# Altium footprint library Connectors.PcbLib: 268 footprints (part 5 of 21)
Each footprint in its own frame and in the unit in brackets; x right, y up, seen from the top. Pads: shape width x height; smd on the part's side, far side on the other; paste and mask are expansions set on the pad; w line width, h text height; cw(c..) or ccw(c..) is an arc to the next point about the centre after c.
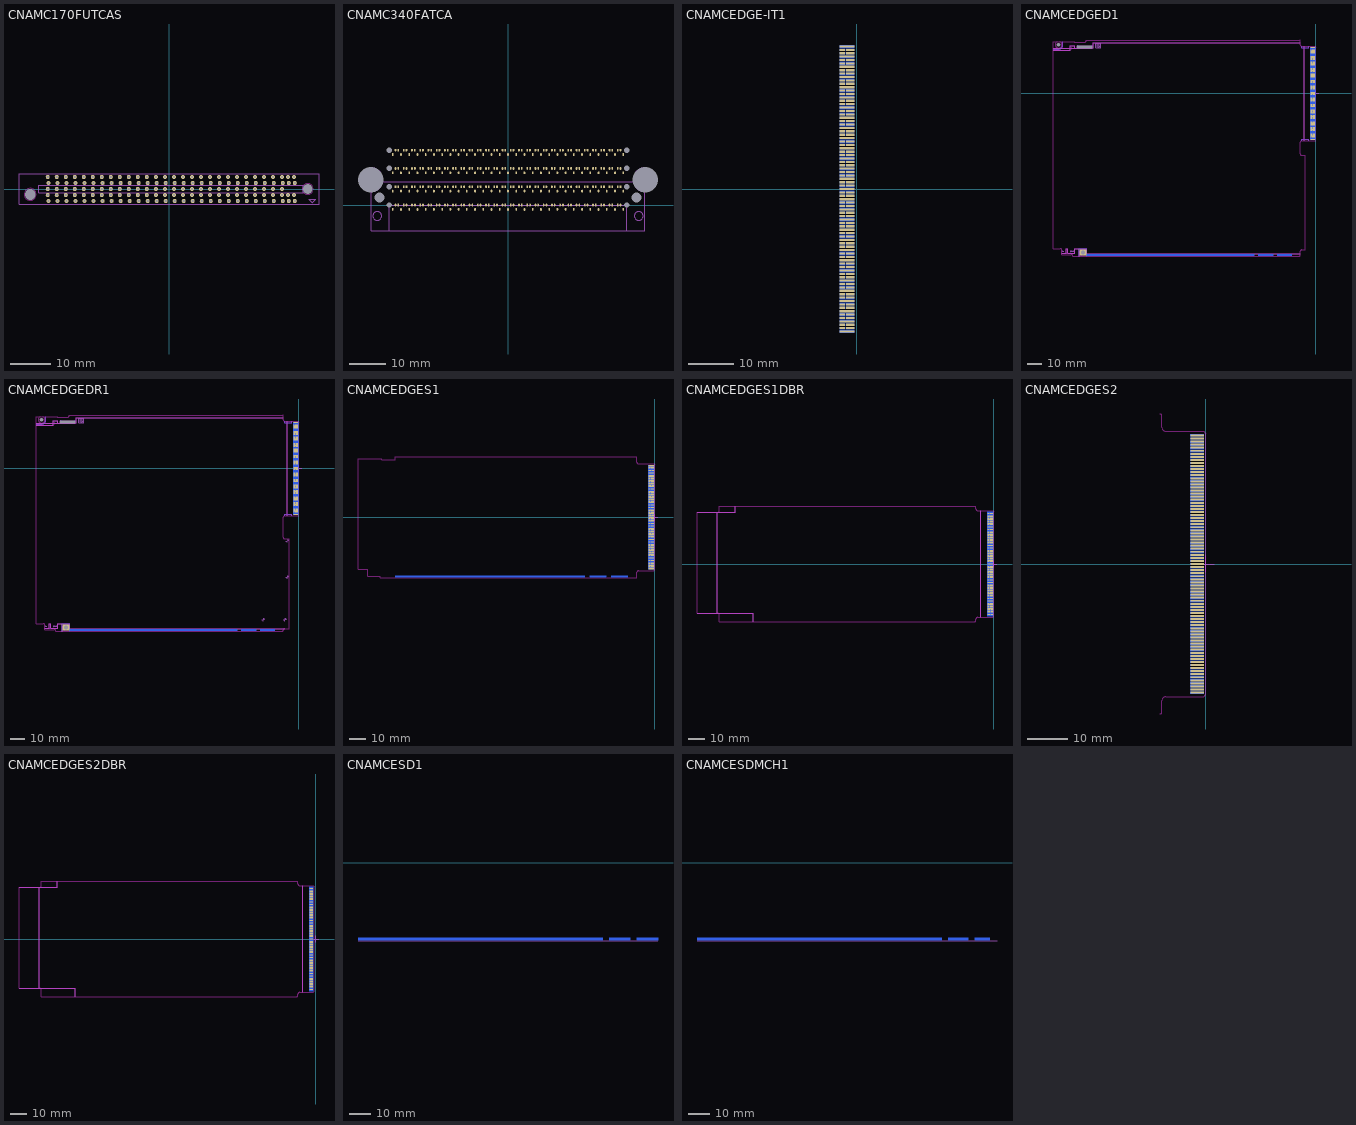
[diagram p4: the footprints below, top view; thin cyan lines are the x and y axes]

## CNAMC170FUTCAS [mm] "AMC uTCA 170 pin vertical snap-in"
height 12.9
pads (172):
  round 1 hole 0.55: 1(31.425,-3) 2(31.225,-1.5) 3(29.925,-3) 4(29.725,-1.5) 5(28.425,-3) 6(28.225,-1.5) 7(28.225,0) 8(26.175,-3) 9(25.975,-1.5) 10(25.975,0) 11(23.925,-3) 12(23.725,-1.5) 13(23.725,0) 14(21.675,-3) 15(21.475,-1.5) 16(21.475,0) 17(19.425,-3) 18(19.225,-1.5) 19(19.225,0) 20(17.175,-3) 21(16.975,-1.5) 22(16.975,0) 23(14.925,-3) 24(14.725,-1.5) 25(14.725,0) 26(12.675,-3) 27(12.475,-1.5) 28(12.475,0) 29(10.425,-3) 30(10.225,-1.5) 31(10.225,0) 32(8.175,-3) 33(7.975,-1.5) 34(7.975,0) 35(5.925,-3) 36(5.725,-1.5) 37(5.725,0) 38(3.675,-3) 39(3.475,-1.5) 40(3.475,0) 41(1.425,-3) 42(1.225,-1.5) 43(1.225,0) 44(-0.825,-3) 45(-1.025,-1.5) 46(-1.025,0) 47(-3.075,-3) 48(-3.275,-1.5) 49(-3.275,0) 50(-5.325,-3) 51(-5.525,-1.5) 52(-5.525,0) 53(-7.575,-3) 54(-7.775,-1.5) 55(-7.775,0) 56(-9.825,-3) 57(-10.025,-1.5) 58(-10.025,0) 59(-12.075,-3) 60(-12.275,-1.5) 61(-12.275,0) 62(-14.325,-3) 63(-14.525,-1.5) 64(-14.525,0) 65(-16.575,-3) 66(-16.775,-1.5) 67(-16.775,0) 68(-18.825,-3) 69(-19.025,-1.5) 70(-19.025,0) 71(-21.075,-3) 72(-21.275,-1.5) 73(-21.275,0) 74(-23.325,-3) 75(-23.525,-1.5) 76(-23.525,0) 77(-25.575,-3) 78(-25.775,-1.5) 79(-25.775,0) 80(-27.825,-3) 81(-28.025,-1.5) 82(-28.025,0) 83(-30.075,-3) 84(-30.275,-1.5) 85(-30.275,0) 87(-30.275,3) 88(-30.075,1.5) 90(-28.025,3) 91(-27.825,1.5) 93(-25.775,3) 94(-25.575,1.5) 96(-23.525,3) 97(-23.325,1.5) 99(-21.275,3) 100(-21.075,1.5) 102(-19.025,3) 103(-18.825,1.5) 105(-16.775,3) 106(-16.575,1.5) 108(-14.525,3) 109(-14.325,1.5) 111(-12.275,3) 112(-12.075,1.5) 114(-10.025,3) 115(-9.825,1.5) 117(-7.775,3) 118(-7.575,1.5) 120(-5.525,3) 121(-5.325,1.5) 123(-3.275,3) 124(-3.075,1.5) 126(-1.025,3) 127(-0.825,1.5) 129(1.225,3) 130(1.425,1.5) 132(3.475,3) 133(3.675,1.5) 135(5.725,3) 136(5.925,1.5) 138(7.975,3) 139(8.175,1.5) 141(10.225,3) 142(10.425,1.5) 144(12.475,3) 145(12.675,1.5) 147(14.725,3) 148(14.925,1.5) 150(16.975,3) 151(17.175,1.5) 153(19.225,3) 154(19.425,1.5) 156(21.475,3) 157(21.675,1.5) 159(23.725,3) 160(23.925,1.5) 162(25.975,3) 163(26.175,1.5) 165(28.225,3) 166(28.425,1.5) 167(29.725,3) 168(29.925,1.5) 169(31.225,3) 170(31.425,1.5)
  round 0.48 smd: 86(-30.275,0) 89(-28.025,0) 92(-25.775,0) 95(-23.525,0) 98(-21.275,0) 101(-19.025,0) 104(-16.775,0) 107(-14.525,0) 110(-12.275,0) 113(-10.025,0) 116(-7.775,0) 119(-5.525,0) 122(-3.275,0) 125(-1.025,0) 128(1.225,0) 131(3.475,0) 134(5.725,0) 137(7.975,0) 140(10.225,0) 143(12.475,0) 146(14.725,0) 149(16.975,0) 152(19.225,0) 155(21.475,-0.025) 158(23.725,0) 161(25.975,0) 164(28.225,0)
  round 0 hole 2.7 unplated: MH1(-34.65,-1.35)
  round 0 hole 2.4 unplated: MH2(34.65,0)
Keep-Out Layer:
  circle w0.1: c-34.65,-1.35 r1.5
  circle w0.1: c34.65,0 r1.35
Mechanical 13:
  lines w0.1: -37.45,-3.75 37.45,-3.75 37.45,3.75 -37.45,3.75 -37.45,-3.75 ; -32.575,-0.95 -32.575,0.95 33.575,0.95 33.575,-0.95 -32.575,-0.95 ; 34.9,-2.5 35.8,-3.4 36.7,-2.5 34.9,-2.5
3D body: height 5.8, standoff 0, extent -32.575,-0.95 33.575,0.95
3D body: height 12.9, standoff 0, extent -37.45,-3.75 37.45,3.75

## CNAMC340FATCA [mm] "AMC ATCA 340 pin horizontal A+B+ 20.32mm"
height 12.9
pads (352):
  oval 0.48x0.75 smd paste-1: 1(31.5,-1.2) 1(31.5,8.8) 2(30.75,0) 2(30.75,10) 3(30,0) 3(30,10) 4(29.25,-1.2) 4(29.25,8.8) 5(28.5,0) 5(28.5,10) 6(27.75,0) 6(27.75,10) 7(27,-1.2) 7(27,8.8) 8(26.25,0) 8(26.25,10) 9(25.5,0) 9(25.5,10) 10(24.75,-1.2) 10(24.75,8.8) 11(24,0) 11(24,10) 12(23.25,0) 12(23.25,10) 13(22.5,-1.2) 13(22.5,8.8) 14(21.75,0) 14(21.75,10) 15(21,0) 15(21,10) 16(20.25,-1.2) 16(20.25,8.8) 17(19.5,0) 17(19.5,10) 18(18.75,0) 18(18.75,10) 19(18,-1.2) 19(18,8.8) 20(17.25,0) 20(17.25,10) 21(16.5,0) 21(16.5,10) 22(15.75,-1.2) 22(15.75,8.8) 23(15,0) 23(15,10) 24(14.25,0) 24(14.25,10) 25(13.5,-1.2) 25(13.5,8.8) 26(12.75,0) 26(12.75,10) 27(12,0) 27(12,10) 28(11.25,-1.2) 28(11.25,8.8) 29(10.5,0) 29(10.5,10) 30(9.75,0) 30(9.75,10) 31(9,-1.2) 31(9,8.8) 32(8.25,0) 32(8.25,10) 33(7.5,0) 33(7.5,10) 34(6.75,-1.2) 34(6.75,8.8) 35(6.05,0) 35(6.05,10) 36(5.25,0) 36(5.25,10) 37(4.5,-1.2) 37(4.5,8.8) 38(3.75,0) 38(3.75,10) 39(3,0) 39(3,10) 40(2.25,-1.2) 40(2.25,8.8) 41(1.5,0) 41(1.5,10) 42(0.75,0) 42(0.75,10) 43(0,-1.2) 43(0,8.8) 44(-0.75,0) 44(-0.75,10) 45(-1.5,0) 45(-1.5,10) 46(-2.25,-1.2) 46(-2.25,8.8) 47(-3,0) 47(-3,10) 48(-3.75,0) 48(-3.75,10) 49(-4.5,-1.2) 49(-4.5,8.8) 50(-5.25,0) 50(-5.25,10) 51(-6,0) 51(-6,10) 52(-6.75,-1.2) 52(-6.75,8.8) 53(-7.5,0) 53(-7.5,10) 54(-8.25,0) 54(-8.25,10) 55(-9,-1.2) 55(-9,8.8) 56(-9.75,0) 56(-9.75,10) 57(-10.5,0) 57(-10.5,10) 58(-11.25,-1.2) 58(-11.25,8.8) 59(-12,0) 59(-12,10) 60(-12.75,0) 60(-12.75,10) 61(-13.5,-1.2) 61(-13.5,8.8) 62(-14.25,0) 62(-14.25,10) 63(-15,0) 63(-15,10) 64(-15.75,-1.2) 64(-15.75,8.8) 65(-16.5,0) 65(-16.5,10) 66(-17.25,0) 66(-17.25,10) 67(-18,-1.2) 67(-18,8.8) 68(-18.75,0) 68(-18.75,10) 69(-19.5,0) 69(-19.5,10) 70(-20.25,-1.2) 70(-20.25,8.8) 71(-21,0) 71(-21,10) 72(-21.75,0) 72(-21.75,10) 73(-22.5,-1.2) 73(-22.5,8.8) 74(-23.25,0) 74(-23.25,10) 75(-24,0) 75(-24,10) 76(-24.75,-1.2) 76(-24.75,8.8) 77(-25.45,0) 77(-25.45,10) 78(-26.25,0) 78(-26.25,10) 79(-27,-1.2) 79(-27,8.8) 80(-27.75,0) 80(-27.75,10) 81(-28.5,0) 81(-28.5,10) 82(-29.25,-1.2) 82(-29.25,8.8) 83(-30,0) 83(-30,10) 84(-30.75,0) 84(-30.75,10) 85(-31.5,-1.2) 85(-31.5,8.8) 86(-31.5,3.8) 86(-31.5,13.8) 87(-30.75,5) 87(-30.75,15) 88(-30,5) 88(-30,15) 89(-29.25,3.8) 89(-29.25,13.8) 90(-28.5,5) 90(-28.5,15) 91(-27.75,5) 91(-27.75,15) 92(-27,3.8) 92(-27,13.8) 93(-26.25,5) 93(-26.25,15) 94(-25.5,5) 94(-25.5,15) 95(-24.75,3.8) 95(-24.75,13.8) 96(-24,5) 96(-24,15) 97(-23.25,5) 97(-23.25,15) 98(-22.5,3.8) 98(-22.5,13.8) 99(-21.75,5) 99(-21.75,15) 100(-21,5) 100(-21,15) 101(-20.25,3.8) 101(-20.25,13.8) 102(-19.5,5) 102(-19.5,15) 103(-18.75,5) 103(-18.75,15) 104(-18,3.8) 104(-18,13.8) 105(-17.25,5) 105(-17.25,15) 106(-16.5,5) 106(-16.5,15) 107(-15.75,3.8) 107(-15.75,13.8) 108(-15,5) 108(-15,15) 109(-14.25,5) 109(-14.25,15) 110(-13.5,3.8) 110(-13.5,13.8) 111(-12.75,5) 111(-12.75,15) 112(-12,5) 112(-12,15) 113(-11.25,3.8) 113(-11.25,13.8) 114(-10.5,5) 114(-10.5,15) 115(-9.75,5) 115(-9.75,15) 116(-9,3.8) 116(-9,13.8) 117(-8.25,5) 117(-8.25,15) 118(-7.5,5) 118(-7.5,15) 119(-6.75,3.8) 119(-6.75,13.8) 120(-6,5) 120(-6,15) 121(-5.25,5) 121(-5.25,15) 122(-4.5,3.8) 122(-4.5,13.8) 123(-3.75,5) 123(-3.75,15) 124(-3,5) 124(-3,15) 125(-2.25,3.8) 125(-2.25,13.8) 126(-1.5,5) 126(-1.5,15) 127(-0.75,5) 127(-0.75,15) 128(-0.025,3.8) 128(-0.025,13.8) 129(0.75,5) 129(0.75,15) 130(1.5,5) 130(1.5,15) 131(2.25,3.8) 131(2.25,13.8) 132(3,5) 132(3,15) 133(3.75,5) 133(3.75,15) 134(4.5,3.8) 134(4.5,13.8) 135(5.25,5) 135(5.25,15) 136(6,5) 136(6,15) 137(6.75,3.8) 137(6.75,13.8) 138(7.5,5) 138(7.5,15) 139(8.25,5) 139(8.25,15) 140(9,3.8) 140(9,13.8) 141(9.75,5) 141(9.75,15) 142(10.5,5) 142(10.5,15) 143(11.25,3.8) 143(11.25,13.8) 144(12,5) 144(12,15) 145(12.75,5) 145(12.75,15) 146(13.5,3.8) 146(13.5,13.8) 147(14.25,5) 147(14.25,15) 148(15,5) 148(15,15) 149(15.75,3.8) 149(15.75,13.8) 150(16.5,5) 150(16.5,15) 151(17.25,5) 151(17.25,15) 152(18,3.8) 152(18,13.8) 153(18.75,5) 153(18.75,15) 154(19.5,5) 154(19.5,15) 155(20.25,3.8) 155(20.25,13.8) 156(21,5) 156(21,15) 157(21.75,5) 157(21.75,15) 158(22.5,3.8) 158(22.5,13.8) 159(23.25,5) 159(23.25,15) 160(24,5) 160(24,15) 161(24.75,3.8) 161(24.75,13.8) 162(25.5,5) 162(25.5,15) 163(26.25,5) 163(26.25,15) 164(27,3.8) 164(27,13.8) 165(27.75,5) 165(27.75,15) 166(28.5,5) 166(28.5,15) 167(29.25,3.8) 167(29.25,13.8) 168(30,5) 168(30,15) 169(30.75,5) 169(30.75,15) 170(31.5,3.8) 170(31.5,13.8)
  round 0 hole 1.5 unplated mask+0.2: MH1(-32.5,0) MH1(-32.5,10) MH2(32.5,0) MH2(32.5,10) MH3(-32.5,5) MH3(-32.5,15) MH4(32.5,5) MH4(32.5,15)
  round 0 hole 2.7 unplated mask+0.2: MH5(-35.15,2) MH6(35.15,2)
  round 0 hole 7 unplated mask+0.3: MH7(37.5,6.9) MH8(-37.5,6.9)
Mechanical 13:
  circle w0.1: c-35.75,-3 r1.2
  circle w0.1: c35.75,-3 r1.2
  lines w0.1: -37.401,3.652 ccw(c-37.5,6.9) -37.4,10.148 ; -37.4,5.55 -37.4,-7 37.4,-7 37.4,5.55 ; -37.4,5.554 ccw(c-37.5,6.9) -37.4,8.246 ; -37.4,8.25 -37.4,10.15 ; -34.3,6.3 34.3,6.3 ; 37.4,3.652 cw(c37.5,6.9) 37.4,10.148 ; 37.4,5.554 cw(c37.5,6.9) 37.4,8.246
Mechanical 15:
  lines w0.1: -32.5,-7 -32.5,-0.1 32.5,-0.1 32.5,-7
  text "DAUGHTER BOARD" at -5.95,-1.3 h0.8
3D body: height 22.5, standoff 21.85, extent 34.55,-4.2 36.95,-1.8
3D body: height 8.25, standoff -5.8, extent -37.4,3.675 -34.25,10.148
3D body: height 17, standoff 0, extent -37.401,-7 37.4,6.3
3D body: height 8.25, standoff -5.8, extent 34.25,3.679 37.401,10.152
3D body: height 22.5, standoff 21.85, extent -36.95,-4.2 -34.55,-1.8
3D body: height 18.9, standoff 17, extent -37.401,-7 37.4,6.3
3D body: height 21.85, standoff 18.9, extent -37.401,-7 37.4,6.3

## CNAMCEDGE-IT1 [mm] "AMC edge connector IT custom"
pads (282):
  rect 1.9x0.48 smd: 0(-1.45,-30.75) 0(-1.45,-30) 0(-1.45,-28.5) 0(-1.45,-27.75) 0(-1.45,-26.25) 0(-1.45,-25.5) 0(-1.45,-24) 0(-1.45,-23.25) 0(-1.45,-21.75) 0(-1.45,-21) 0(-1.45,-19.5) 0(-1.45,-18.75) 0(-1.45,-17.25) 0(-1.45,-16.5) 0(-1.45,-15) 0(-1.45,-14.25) 0(-1.45,-12.75) 0(-1.45,-12) 0(-1.45,-10.5) 0(-1.45,-9.75) 0(-1.45,-8.25) 0(-1.45,-7.5) 0(-1.45,-6) 0(-1.45,-5.25) 0(-1.45,-3.75) 0(-1.45,-3) 0(-1.45,-1.5) 0(-1.45,-0.75) 0(-1.45,0.75) 0(-1.45,1.5) 0(-1.45,3) 0(-1.45,3.75) 0(-1.45,5.25) 0(-1.45,6) 0(-1.45,7.5) 0(-1.45,8.25) 0(-1.45,9.75) 0(-1.45,10.5) 0(-1.45,12) 0(-1.45,12.75) 0(-1.45,14.25) 0(-1.45,15) 0(-1.45,16.5) 0(-1.45,17.25) 0(-1.45,18.75) 0(-1.45,19.5) 0(-1.45,21) 0(-1.45,21.75) 0(-1.45,23.25) 0(-1.45,24) 0(-1.45,25.5) 0(-1.45,26.25) 0(-1.45,27.75) 0(-1.45,28.5) 0(-1.45,30) 0(-1.45,30.75)
  rect 1.9x0.48 smd far side: 0(-1.45,-30.75) 0(-1.45,-30) 0(-1.45,-28.5) 0(-1.45,-27.75) 0(-1.45,-26.25) 0(-1.45,-25.5) 0(-1.45,-24) 0(-1.45,-23.25) 0(-1.45,-21.75) 0(-1.45,-21) 0(-1.45,-19.5) 0(-1.45,-18.75) 0(-1.45,-17.25) 0(-1.45,-16.5) 0(-1.45,-15) 0(-1.45,-14.25) 0(-1.45,-12.75) 0(-1.45,-12) 0(-1.45,-10.5) 0(-1.45,-9.75) 0(-1.45,-8.25) 0(-1.45,-7.5) 0(-1.45,-6) 0(-1.45,-5.25) 0(-1.45,-3.75) 0(-1.45,-3) 0(-1.45,-1.5) 0(-1.45,-0.75) 0(-1.45,0.75) 0(-1.45,1.5) 0(-1.45,3) 0(-1.45,3.75) 0(-1.45,5.25) 0(-1.45,6) 0(-1.45,7.5) 0(-1.45,8.25) 0(-1.45,9.75) 0(-1.45,10.5) 0(-1.45,12) 0(-1.45,12.75) 0(-1.45,14.25) 0(-1.45,15) 0(-1.45,16.5) 0(-1.45,17.25) 0(-1.45,18.75) 0(-1.45,19.5) 0(-1.45,21) 0(-1.45,21.75) 0(-1.45,23.25) 0(-1.45,24) 0(-1.45,25.5) 0(-1.45,26.25) 0(-1.45,27.75) 0(-1.45,28.5) 0(-1.45,30) 0(-1.45,30.75)
  rect 3.3x0.48 smd: 1(-2.15,31.5) 4(-2.15,29.25) 7(-2.15,27) 10(-2.15,24.75) 13(-2.15,22.5) 16(-2.15,20.25) 19(-2.15,18) 22(-2.15,15.75) 25(-2.15,13.5) 28(-2.15,11.25) 31(-2.15,9) 34(-2.15,6.75) 37(-2.15,4.5) 40(-2.15,2.25) 43(-2.15,0) 46(-2.15,-2.25) 49(-2.15,-4.5) 52(-2.15,-6.75) 55(-2.15,-9) 58(-2.15,-11.25) 61(-2.15,-13.5) 64(-2.15,-15.75) 67(-2.15,-18) 70(-2.15,-20.25) 73(-2.15,-22.5) 76(-2.15,-24.75) 79(-2.15,-27) 82(-2.15,-29.25) 85(-2.15,-31.5)
  rect 1.2x0.48 smd: 2(-3.2,30.75) 3(-3.2,30) 5(-3.2,28.5) 6(-3.2,27.75) 8(-3.2,26.25) 9(-3.2,25.5) 11(-3.2,24) 12(-3.2,23.25) 14(-3.2,21.75) 15(-3.2,21) 17(-3.2,19.5) 18(-3.2,18.75) 20(-3.2,17.25) 21(-3.2,16.5) 23(-3.2,15) 24(-3.2,14.25) 26(-3.2,12.75) 27(-3.2,12) 29(-3.2,10.5) 30(-3.2,9.75) 32(-3.2,8.25) 33(-3.2,7.5) 35(-3.2,6) 36(-3.2,5.25) 38(-3.2,3.75) 39(-3.2,3) 41(-3.2,1.5) 42(-3.2,0.75) 44(-3.2,-0.75) 45(-3.2,-1.5) 47(-3.2,-3) 48(-3.2,-3.75) 50(-3.2,-5.25) 51(-3.2,-6) 53(-3.2,-7.5) 54(-3.2,-8.25) 56(-3.2,-9.75) 57(-3.2,-10.5) 59(-3.2,-12) 60(-3.2,-12.75) 62(-3.2,-14.25) 63(-3.2,-15) 65(-3.2,-16.5) 66(-3.2,-17.25) 68(-3.2,-18.75) 69(-3.2,-19.5) 71(-3.2,-21) 72(-3.2,-21.75) 74(-3.2,-23.25) 75(-3.2,-24) 77(-3.2,-25.5) 78(-3.2,-26.25) 80(-3.2,-27.75) 81(-3.2,-28.5) 83(-3.2,-30) 84(-3.2,-30.75)
  rect 3.3x0.48 smd far side: 86(-2.15,-31.5) 89(-2.15,-29.25) 92(-2.15,-27) 95(-2.15,-24.75) 98(-2.15,-22.5) 101(-2.15,-20.25) 104(-2.15,-18) 107(-2.15,-15.75) 110(-2.15,-13.5) 113(-2.15,-11.25) 116(-2.15,-9) 119(-2.15,-6.75) 122(-2.15,-4.5) 125(-2.15,-2.25) 128(-2.15,0) 131(-2.15,2.25) 134(-2.15,4.5) 137(-2.15,6.75) 140(-2.15,9) 143(-2.15,11.25) 146(-2.15,13.5) 149(-2.15,15.75) 152(-2.15,18) 155(-2.15,20.25) 158(-2.15,22.5) 161(-2.15,24.75) 164(-2.15,27) 167(-2.15,29.25) 170(-2.15,31.5)
  rect 1.2x0.48 smd far side: 87(-3.2,-30.75) 88(-3.2,-30) 90(-3.2,-28.5) 91(-3.2,-27.75) 93(-3.2,-26.25) 94(-3.2,-25.5) 96(-3.2,-24) 97(-3.2,-23.25) 99(-3.2,-21.75) 100(-3.2,-21) 102(-3.2,-19.5) 103(-3.2,-18.75) 105(-3.2,-17.25) 106(-3.2,-16.5) 108(-3.2,-15) 109(-3.2,-14.25) 111(-3.2,-12.75) 112(-3.2,-12) 114(-3.2,-10.5) 115(-3.2,-9.75) 117(-3.2,-8.25) 118(-3.2,-7.5) 120(-3.2,-6) 121(-3.2,-5.25) 123(-3.2,-3.75) 124(-3.2,-3) 126(-3.2,-1.5) 127(-3.2,-0.75) 129(-3.2,0.75) 130(-3.2,1.5) 132(-3.2,3) 133(-3.2,3.75) 135(-3.2,5.25) 136(-3.2,6) 138(-3.2,7.5) 139(-3.2,8.25) 141(-3.2,9.75) 142(-3.2,10.5) 144(-3.2,12) 145(-3.2,12.75) 147(-3.2,14.25) 148(-3.2,15) 150(-3.2,16.5) 151(-3.2,17.25) 153(-3.2,18.75) 154(-3.2,19.5) 156(-3.2,21) 157(-3.2,21.75) 159(-3.2,23.25) 160(-3.2,24) 162(-3.2,25.5) 163(-3.2,26.25) 165(-3.2,27.75) 166(-3.2,28.5) 168(-3.2,30) 169(-3.2,30.75)

## CNAMCEDGED1 [mm] "AMC double edge connector standard"
pads (286):
  rect 2.2x0.48 smd paste-3: 0(-1.6,-30) 0(-1.6,30)
  rect 1.9x0.48 smd far side paste-3 mask-3: 0(-1.45,-30.75) 0(-1.45,-30) 0(-1.45,-28.5) 0(-1.45,-27.75) 0(-1.45,-26.25) 0(-1.45,-25.5) 0(-1.45,-24) 0(-1.45,-23.25) 0(-1.45,-21.75) 0(-1.45,-21) 0(-1.45,-19.5) 0(-1.45,-18.75) 0(-1.45,-17.25) 0(-1.45,-16.5) 0(-1.45,-15) 0(-1.45,-14.25) 0(-1.45,-12.75) 0(-1.45,-12) 0(-1.45,-10.5) 0(-1.45,-9.75) 0(-1.45,-8.25) 0(-1.45,-7.5) 0(-1.45,-6) 0(-1.45,-5.25) 0(-1.45,-3.75) 0(-1.45,-3) 0(-1.45,-1.5) 0(-1.45,-0.75) 0(-1.45,0.75) 0(-1.45,1.5) 0(-1.45,3) 0(-1.45,3.75) 0(-1.45,5.25) 0(-1.45,6) 0(-1.45,7.5) 0(-1.45,8.25) 0(-1.45,9.75) 0(-1.45,10.5) 0(-1.45,12) 0(-1.45,12.75) 0(-1.45,14.25) 0(-1.45,15) 0(-1.45,16.5) 0(-1.45,17.25) 0(-1.45,18.75) 0(-1.45,19.5) 0(-1.45,21) 0(-1.45,21.75) 0(-1.45,23.25) 0(-1.45,24) 0(-1.45,25.5) 0(-1.45,26.25)
  rect 1.9x0.48 smd paste-3: 0(-1.45,-28.5) 0(-1.45,-27.75) 0(-1.45,-26.25) 0(-1.45,-25.5) 0(-1.45,-24) 0(-1.45,-23.25) 0(-1.45,-19.5) 0(-1.45,-18.75) 0(-1.45,-17.25) 0(-1.45,-16.5) 0(-1.45,-15) 0(-1.45,-14.25) 0(-1.45,-12.75) 0(-1.45,-12) 0(-1.45,-8.25) 0(-1.45,-7.5) 0(-1.45,-6) 0(-1.45,-5.25) 0(-1.45,-3.75) 0(-1.45,-3) 0(-1.45,-1.5) 0(-1.45,-0.75) 0(-1.45,3) 0(-1.45,3.75) 0(-1.45,5.25) 0(-1.45,6) 0(-1.45,7.5) 0(-1.45,8.25) 0(-1.45,9.75) 0(-1.45,10.5) 0(-1.45,14.25) 0(-1.45,15) 0(-1.45,16.5) 0(-1.45,17.25) 0(-1.45,21) 0(-1.45,21.75) 0(-1.45,23.25) 0(-1.45,24)
  rect 1.15x0.48 smd paste-3: 0(-1.075,-21) 0(-1.075,-9.75) 0(-1.075,1.5) 0(-1.075,12.75) 0(-1.075,19.5) 0(-1.075,26.25) 0(-1.075,27.75) 0(-1.075,28.5)
  rect 1.15x0.48 smd far side paste-3 mask-3: 0(-1.075,27.75) 0(-1.075,28.5) 0(-1.075,29.25) 0(-1.075,30) 0(-1.075,30.75)
  oval 11x2 on Top Solder: 1(-159,31.95)
  rect 3.3x0.48 smd paste-3: 1(-2.15,31.5) 2(-2.15,30.75) 4(-2.15,29.25) 7(-2.15,27) 9(-2.15,25.5) 10(-2.15,24.75) 13(-2.15,22.5) 16(-2.15,20.25) 18(-2.15,18.75) 19(-2.15,18) 22(-2.15,15.75) 25(-2.15,13.5) 27(-2.15,12) 28(-2.15,11.25) 31(-2.15,9) 34(-2.15,6.75) 37(-2.15,4.5) 40(-2.15,2.25) 42(-2.15,0.75) 43(-2.15,0) 46(-2.15,-2.25) 49(-2.15,-4.5) 52(-2.15,-6.75) 55(-2.15,-9) 57(-2.15,-10.5) 58(-2.15,-11.25) 61(-2.15,-13.5) 64(-2.15,-15.75) 67(-2.15,-18) 70(-2.15,-20.25) 72(-2.15,-21.75) 73(-2.15,-22.5) 76(-2.15,-24.75) 79(-2.15,-27) 82(-2.15,-29.25) 84(-2.15,-30.75) 85(-2.15,-31.5)
  oval 11x2 on Bottom Solder: 2(-159,31.95)
  rect 0.9x0.48 smd paste-3: 3(-3.35,30) 83(-3.35,-30)
  rect 1.95x0.48 smd paste-3: 5(-2.825,28.5) 6(-2.825,27.75) 8(-2.825,26.25) 17(-2.825,19.5) 26(-2.825,12.75) 41(-2.825,1.5) 56(-2.825,-9.75) 71(-2.825,-21)
  rect 1.2x0.48 smd paste-3: 11(-3.2,24) 12(-3.2,23.25) 14(-3.2,21.75) 15(-3.2,21) 20(-3.2,17.25) 21(-3.2,16.5) 23(-3.2,15) 24(-3.2,14.25) 29(-3.2,10.5) 30(-3.2,9.75) 32(-3.2,8.25) 33(-3.2,7.5) 35(-3.2,6) 36(-3.2,5.25) 38(-3.2,3.75) 39(-3.2,3) 44(-3.2,-0.75) 45(-3.2,-1.5) 47(-3.2,-3) 48(-3.2,-3.75) 50(-3.2,-5.25) 51(-3.2,-6) 53(-3.2,-7.5) 54(-3.2,-8.25) 59(-3.2,-12) 60(-3.2,-12.75) 62(-3.2,-14.25) 63(-3.2,-15) 65(-3.2,-16.5) 66(-3.2,-17.25) 68(-3.2,-18.75) 69(-3.2,-19.5) 74(-3.2,-23.25) 75(-3.2,-24) 77(-3.2,-25.5) 78(-3.2,-26.25) 80(-3.2,-27.75) 81(-3.2,-28.5)
  rect 3.3x0.48 smd far side paste-3 mask-3: 86(-2.15,-31.5) 89(-2.15,-29.25) 92(-2.15,-27) 95(-2.15,-24.75) 98(-2.15,-22.5) 101(-2.15,-20.25) 104(-2.15,-18) 107(-2.15,-15.75) 110(-2.15,-13.5) 113(-2.15,-11.25) 116(-2.15,-9) 119(-2.15,-6.75) 122(-2.15,-4.5) 125(-2.15,-2.25) 128(-2.15,0) 131(-2.15,2.25) 134(-2.15,4.5) 137(-2.15,6.75) 140(-2.15,9) 143(-2.15,11.25) 146(-2.15,13.5) 149(-2.15,15.75) 152(-2.15,18) 155(-2.15,20.25) 158(-2.15,22.5) 161(-2.15,24.75) 164(-2.15,27) 170(-2.15,31.5)
  rect 1.2x0.48 smd far side paste-3 mask-3: 87(-3.2,-30.75) 88(-3.2,-30) 90(-3.2,-28.5) 91(-3.2,-27.75) 93(-3.2,-26.25) 94(-3.2,-25.5) 96(-3.2,-24) 97(-3.2,-23.25) 99(-3.2,-21.75) 100(-3.2,-21) 102(-3.2,-19.5) 103(-3.2,-18.75) 105(-3.2,-17.25) 106(-3.2,-16.5) 108(-3.2,-15) 109(-3.2,-14.25) 111(-3.2,-12.75) 112(-3.2,-12) 114(-3.2,-10.5) 115(-3.2,-9.75) 117(-3.2,-8.25) 118(-3.2,-7.5) 120(-3.2,-6) 121(-3.2,-5.25) 123(-3.2,-3.75) 124(-3.2,-3) 126(-3.2,-1.5) 127(-3.2,-0.75) 129(-3.2,0.75) 130(-3.2,1.5) 132(-3.2,3) 133(-3.2,3.75) 135(-3.2,5.25) 136(-3.2,6) 138(-3.2,7.5) 139(-3.2,8.25) 141(-3.2,9.75) 142(-3.2,10.5) 144(-3.2,12) 145(-3.2,12.75) 147(-3.2,14.25) 148(-3.2,15) 150(-3.2,16.5) 151(-3.2,17.25) 153(-3.2,18.75) 154(-3.2,19.5) 156(-3.2,21) 157(-3.2,21.75) 159(-3.2,23.25) 160(-3.2,24) 162(-3.2,25.5) 163(-3.2,26.25)
  rect 1.95x0.48 smd far side paste-3 mask-3: 165(-2.825,27.75) 166(-2.825,28.5) 167(-2.825,29.25) 168(-2.825,30) 169(-2.825,30.75)
  rect 10x1 smd far side paste-3 mask-3: EP1(-21.5,-110.95) EP1(-21.5,-110.95) EP2(-34.5,-110.95) EP2(-34.5,-110.95)
  rect 4.7x4.4 hole 2.7 copper offset 0,0.15 paste-2.54 mask+0.254: EP3(-160,-109.4)
  rect 115.5x1 smd far side paste-3 mask-3: EP3(-100.25,-110.95) EP3(-100.25,-110.95)
  round 0 hole 2.7 unplated paste-2.54 mask+1.8: MH2(-176.85,33.5)
  round 0 hole 1.6 slot 10.6 at 0 deg unplated: MH3(-159,31.95)
Top Layer keep-out:
  lines w0.1: -180.6,30.85 -175.665,30.85 ; -174.6,-109.9 -165.8,-109.9 -165.8,-106.8 -157.4,-106.8 -157.4,-111.75 ; -173.95,33.501 -173.95,35.65 ; -9.8,-32.5 -9.8,-31.3 -5,-31.3 -5,-32.5 ; -9.8,32.5 -9.8,31.3 -5,31.3 -5,32.5
  lines w0.102: -175.665,30.851 ccw(c-176.86,33.501) -173.953,33.494
Bottom Layer keep-out:
  lines w0.1: -162.625,-111.75 -162.625,-106.8 -157.4,-106.8 -157.4,-111.75 ; -9.8,-32.5 -9.8,-31.3 -5,-31.3 -5,-32.5 ; -9.8,32.5 -9.8,31.3 -5,31.3 -5,32.5
  lines w0.102: -180.6,30.5 -176.85,30.5 ccw(c-176.85,33.5) -173.85,33.493 -173.85,35.65
Top Solder:
  rectangle: -158,35.1 -10.6,36.9
  rectangle: -157.475,-111.9 -10.6,-110.1
  rectangle: -3.9,-32.75 0.25,32.75
Bottom Solder:
  rectangle: -157.475,-111.9 -10.6,-110.1
  rectangle: -3.9,-32.75 0.25,32.75
  rectangle: -158,35.1 -10.6,36.9
Keep-Out Layer:
  lines w0.1: -168,-110.75 -174.6,-110.75 -174.6,-107.55 ccw(c-175.6,-107.55) -175.6,-106.55 -180.6,-106.55 -180.6,35.65 -166.25,35.65 ccw(c-165.384,36.15) -165.384,35.15 -159,35.15 ccw(c-159,36.15) -158,36.15 -158,36.75 -11.3,36.75 cw(c-11.3,36.25) -10.8,36.25 -10.8,33.5 ccw(c-9.8,33.5) -9.8,32.5 -0.6,32.5 0,31.9 0,-31.9 -0.6,-32.5 -9.8,-32.5 ccw(c-9.8,-33.5) -10.8,-33.5 -10.8,-41.5 ccw(c-9.8,-41.5) -9.8,-42.5 -7.5,-42.5 -7.5,-107.5 -9.8,-107.5 ccw(c-9.8,-108.5) -10.8,-108.5 -10.8,-111.25 cw(c-11.3,-111.25) -11.3,-111.75 -167,-111.75
Keep-Out Layer:
  circle w0.1: c-160,-109.4 r2.3
  lines w0.1: -177.674,35.647 ccw(c-176.85,33.5) -176.026,35.647 ; -168,-110.75 cw(c-168,-111.75) -167,-111.75 ; -163.5,30.95 cw(c-163.5,31.95) -163.5,32.95 -154,32.95 cw(c-154,31.95) -154,30.95 -163.5,30.95
Mechanical 13 keep-out:
  lines w0.1: -180.6,30.95 -153.6,30.95 -153,31.55 -153,35 -10.8,35 ; -174.6,-109.9 -171.7,-109.9 -171.7,-106.8 -170.4,-106.8 -170.4,-109.9 -165.8,-109.9 -165.8,-106.8 -157.4,-106.8 -157.4,-110 -10.8,-110 ; -7.9,-32.475 -7.9,32.525
Mechanical 14 keep-out:
  lines w0.1: -168.8,29.8 -168.8,32.975 -165.65,32.975 -165.65,30.95 -153.6,30.95 -153,31.55 -153,35 -10.8,35 ; -162.6,-111.75 -162.6,-106.8 -157.4,-106.8 -157.4,-110 -10.8,-110 ; -7.9,-32.5 -7.9,32.5
  lines w0.102: -180.6,29.8 -168.8,29.8
Mechanical 15:
  lines w0.1: -174.25,-108.325 -173.45,-108.325 -173.85,-107.925 -173.85,-108.725 ; -168.6,-107.95 -168.6,-108.75 -169,-108.35 -166.5,-108.35 -166.9,-107.95 -166.9,-108.75 ; -168.167,31 -167.367,31 -167.767,30.6 -167.767,31.4 ; -167.75,-108.75 -167.75,-107.95 ; -151.35,32.7 -147.85,32.7 -149.6,31.3 -149.6,34.1 ; -151.35,31.3 -151.35,34.1 -147.85,34.1 -147.85,31.3 -151.35,31.3
  lines w0.15: -2,0 2,0 ; 0,-2 0,2
